# Altium footprint library UltraZOhm_CarrierBoard.PcbLib: 123 footprints (part 3 of 8)
Each footprint in its own frame and in the unit in brackets; x right, y up, seen from the top. Pads: shape width x height; smd on the part's side, far side on the other; paste and mask are expansions set on the pad; w line width, h text height; cw(c..) or ccw(c..) is an arc to the next point about the centre after c.
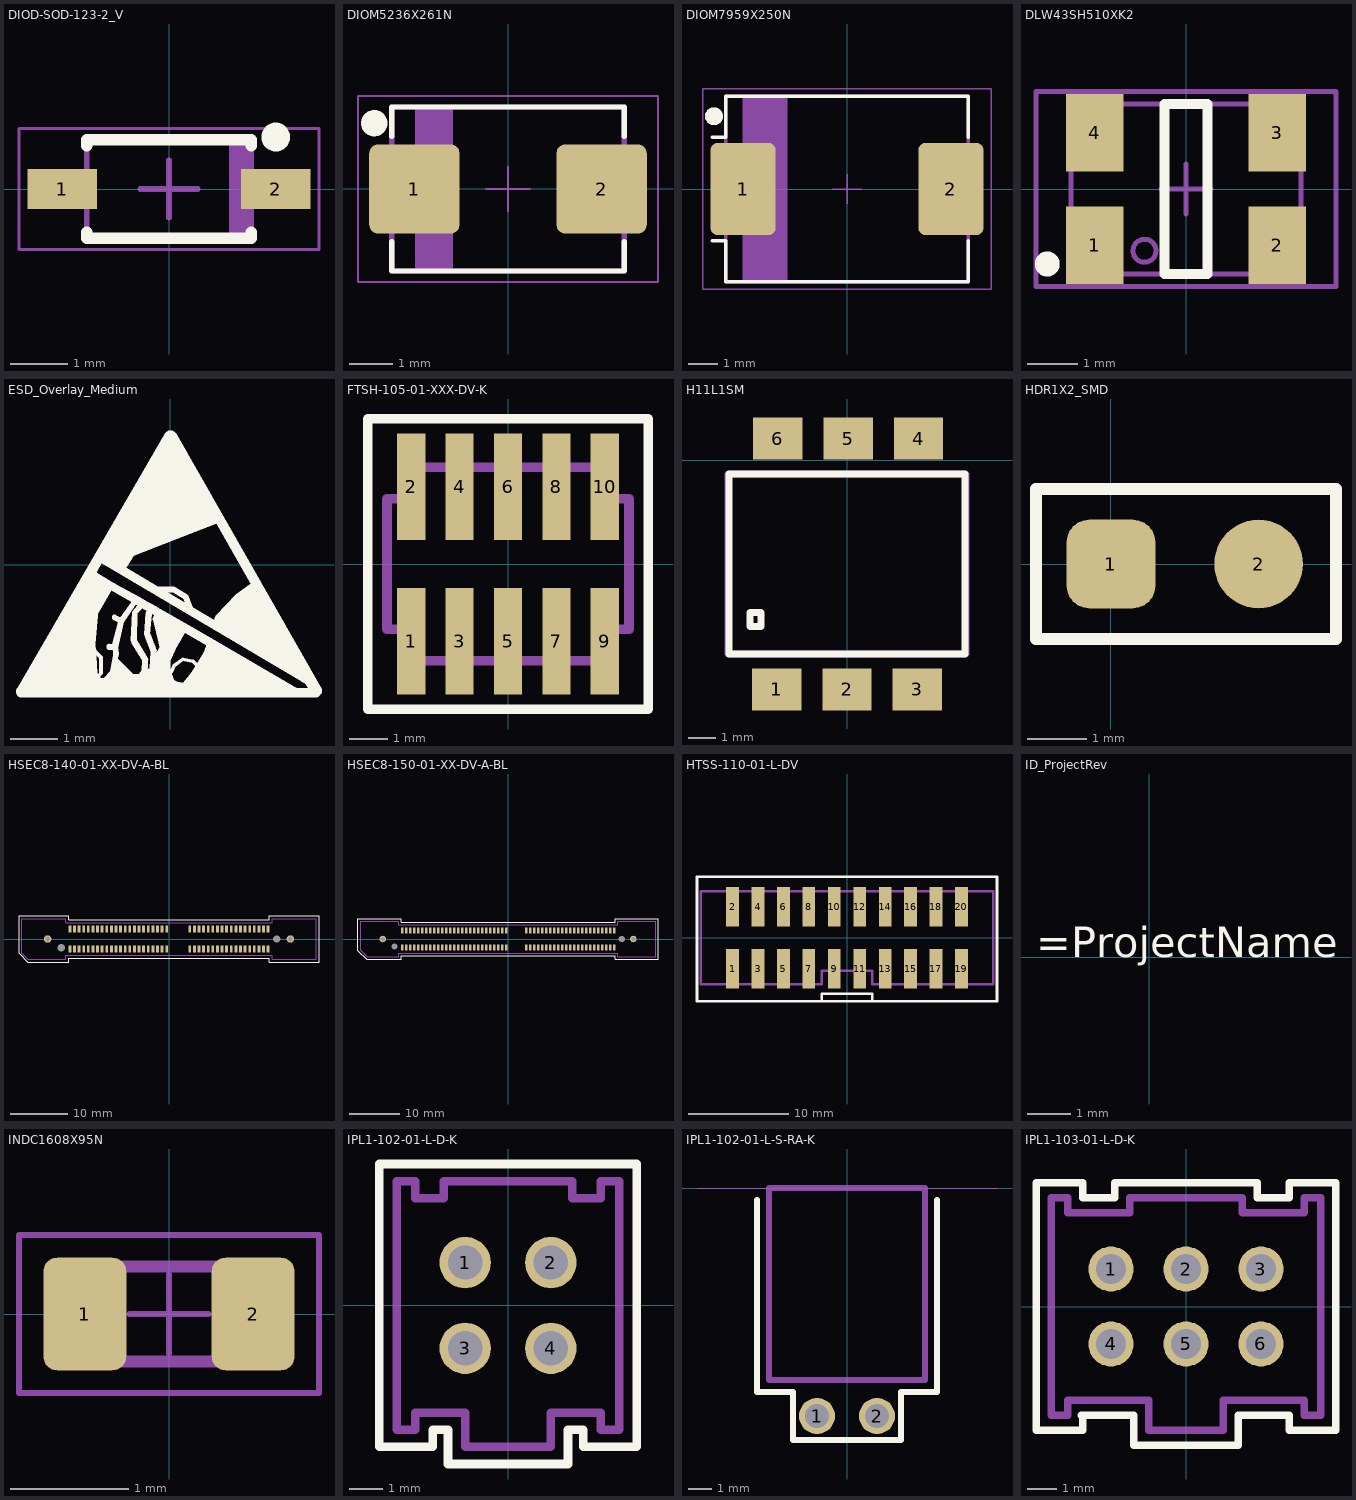
[diagram p2: the footprints below, top view; thin cyan lines are the x and y axes]

## DIOD-SOD-123-2_V [mm] "SOD-123, 2-Leads, Body 2.85x1.7mm (max), Pitch 3.7mm"
height 1.45
pads (2):
  rect 1.2x0.7 smd: 1(-1.85,0) 2(1.85,0)
Top Overlay:
  circle w0.25: c1.85,0.9 r0.125
  lines w0.2: -1.425,-0.75 -1.425,-0.85 1.425,-0.85 1.425,-0.75 ; -1.425,0.75 -1.425,0.85 1.425,0.85 1.425,0.75
Top Assembly:
  rectangle: 1.042,-0.85 1.425,0.85
  lines w0.1: -1.425,-0.85 -1.425,0.85 1.425,0.85 1.425,-0.85 -1.425,-0.85
  text ".Designator" at -1.12,-0.39 h0.76
Mechanical 15:
  lines w0.05: -2.6,-1.05 -2.6,1.05 2.6,1.05 2.6,-1.05 -2.6,-1.05
  lines w0.1: -0.5,0 0.5,0 ; 0,-0.5 0,0.5
3D body: height 1.45, standoff 0, extent -1.425,-0.85 1.425,0.85

## DIOM5236X261N [mm]
height 2.61
pads (2):
  rrect20% 2.06x2.04 smd: 1(-2.135,0) 2(2.135,0)
Top Overlay:
  circle w0.3: c-3.05,1.5 r0.15
  lines w0.12: -2.65,-1.2 -2.65,-1.87 2.65,-1.87 2.65,-1.2 ; -2.65,1.2 -2.65,1.87 2.65,1.87 2.65,1.2
Top Assembly:
  rectangle: -2.125,-1.875 -1.25,1.875
  lines w0.12: -2.65,-1.87 -2.65,1.87 2.65,1.87 2.65,-1.87 -2.65,-1.87
  text ".Designator" at -0.9,-0.775 h1.52
Mechanical 15:
  lines w0.05: -0.5,0 0.5,0 ; 0,-0.5 0,0.5 ; -3.42,-2.12 -3.42,2.12 3.42,2.12 3.42,-2.12 -3.42,-2.12
3D body "User Library-DO-214AA_SMB.STEP": height 2.2, standoff -0.05, extent -2.65,-1.85 2.65,1.85

## DIOM7959X250N [mm]
height 2.5
pads (2):
  rrect20% 2.18x3.09 smd: 1(-3.485,0) 2(3.485,0)
Top Overlay:
  circle w0.3: c-4.46,2.44 r0.15
  lines w0.12: -4.51,-1.74 -4.07,-1.74 -4.07,-3.11 4.07,-3.11 4.07,-1.74 ; -4.51,1.74 -4.07,1.74 -4.07,3.11 4.07,3.11 4.07,1.74
Top Assembly:
  rectangle: -3.5,-3.1 -2,3.11
  lines w0.12: -4.07,-3.11 4.07,-3.11 4.07,3.11 -4.07,3.11 -4.07,-3.11
  text ".Designator" at -1.5,-0.875 h1.52
Mechanical 15:
  lines w0.05: -0.5,0 0.5,0 ; 0,-0.5 0,0.5 ; -4.83,-3.36 4.83,-3.36 4.83,3.36 -4.83,3.36 -4.83,-3.36
3D body "User Library-DIOM8261X24.STEP": height 2.4, standoff 0.03, extent -4.065,-3.05 4.065,3.05

## DLW43SH510XK2 [mm] "SMD Line Filter, 4-Leads, Body 4.5x3.2mm"
height 3
pads (4):
  rect 1.15x1.55 smd: 1(-1.825,-1.125) 2(1.825,-1.125) 3(1.825,1.125) 4(-1.825,1.125)
Top Overlay:
  circle w0.25: c-2.775,-1.5 r0.125
  lines w0.2: -0.425,-1.7 -0.425,1.7 0.425,1.7 0.425,-1.7 -0.425,-1.7
Top Assembly:
  lines w0.1: -2.3,-1.7 -2.3,1.7 2.3,1.7 2.3,-1.7 -2.3,-1.7 ; -0.6,-1.25 ccw(c-0.829,-1.235) -0.6,-1.25
  text ".Designator" at -1.2,-0.275 h1.52
Mechanical 15:
  lines w0.1: -0.5,0 0.5,0 ; 0,-0.5 0,0.5 ; -3,-1.95 -3,1.95 3,1.95 3,-1.95 -3,-1.95
3D body "WE-CNSW_1812_CNSW.stp": height 2.8, standoff -0.05, extent -2.25,-1.6 2.25,1.6

## ESD_Overlay_Medium [mm]
height 11.303
Top Overlay:
  drawing of 6916 lines, arcs and shapes, not listed

## FTSH-105-01-XXX-DV-K [mil]
pads (10):
  rect 29x110 smd mask+2: 1(-100,-80) 2(-100,80) 3(-50,-80) 4(-50,80) 5(0,-80) 6(0,80) 7(50,-80) 8(50,80) 9(100,-80) 10(100,80)
Top Overlay:
  lines w10: -145,-150 -145,150 145,150 145,-150 -145,-150
Top Assembly:
  lines w10: -125,-67.5 -125,67.5 -100,67.5 -100,100 100,100 100,67.5 125,67.5 125,-67.5 100,-67.5 100,-100 -100,-100 -100,-67.5 -125,-67.5
  text ".Designator" at -64.38,-32.26 h60
3D body "FTSH-105-01-L-DV-K.stp": height 225, standoff -16, extent -125,-115 125,115

## H11L1SM [mm] "Optokoppler + Schmitt-Trigger, 1 MHz, SMT 6-Pin (Lead Bend)"
height 5.08
pads (6):
  rect 1.78x1.52 smd: 1(-2.54,-8.27) 2(0,-8.27) 3(2.54,-8.27) 4(2.58,0.775) 5(0.04,0.775) 6(-2.5,0.775)
Top Overlay:
  lines w0.254: -4.25,-7 -4.25,-0.5 4.25,-0.5 4.25,-7 -4.25,-7 ; -3.5,-6 -3.1,-6 -3.1,-5.5 -3.5,-5.5 -3.5,-6
Top Assembly:
  lines w0.254: -4.3,-7 4.3,-7 4.3,-0.5 -4.3,-0.5 -4.3,-7
  text ".Designator" at -2.1,-4.675 h1.52
3D body: height 5.08, standoff 0.38, extent -4.25,-7 4.25,-0.5

## HDR1X2_SMD [mm] "SMD Connector; Header; 2 Position"
pads (2):
  rrect50% 1.5x1.5 smd: 1(0,0)
  round 1.5 smd: 2(2.5,0)
Top Overlay:
  lines w0.2: -1.27,-1.27 -1.27,1.27 3.81,1.27 3.81,-1.27 -1.27,-1.27
Top Assembly:
  lines w0.2: -1.27,-1.27 3.81,-1.27 3.81,1.27 -1.27,1.27 -1.27,-1.27
  text ".Designator" at -0.8,-0.775 h1.52

## HSEC8-140-01-XX-DV-A-BL [mm]
pads (84):
  rect 0.5x1.2 smd mask+0.05: 1(-17.2,-1.7) 2(-17.2,1.7) 3(-16.4,-1.7) 4(-16.4,1.7) 5(-15.6,-1.7) 6(-15.6,1.7) 7(-14.8,-1.7) 8(-14.8,1.7) 9(-14,-1.7) 10(-14,1.7) 11(-13.2,-1.7) 12(-13.2,1.7) 13(-12.4,-1.7) 14(-12.4,1.7) 15(-11.6,-1.7) 16(-11.6,1.7) 17(-10.8,-1.7) 18(-10.8,1.7) 19(-10,-1.7) 20(-10,1.7) 21(-9.2,-1.7) 22(-9.2,1.7) 23(-8.4,-1.7) 24(-8.4,1.7) 25(-7.6,-1.7) 26(-7.6,1.7) 27(-6.8,-1.7) 28(-6.8,1.7) 29(-6,-1.7) 30(-6,1.7) 31(-5.2,-1.7) 32(-5.2,1.7) 33(-4.4,-1.7) 34(-4.4,1.7) 35(-3.6,-1.7) 36(-3.6,1.7) 37(-2.8,-1.7) 38(-2.8,1.7) 39(-2,-1.7) 40(-2,1.7) 41(-1.2,-1.7) 42(-1.2,1.7) 43(-0.4,-1.7) 44(-0.4,1.7) 45(3.6,-1.7) 46(3.6,1.7) 47(4.4,-1.7) 48(4.4,1.7) 49(5.2,-1.7) 50(5.2,1.7) 51(6,-1.7) 52(6,1.7) 53(6.8,-1.7) 54(6.8,1.7) 55(7.6,-1.7) 56(7.6,1.7) 57(8.4,-1.7) 58(8.4,1.7) 59(9.2,-1.7) 60(9.2,1.7) 61(10,-1.7) 62(10,1.7) 63(10.8,-1.7) 64(10.8,1.7) 65(11.6,-1.7) 66(11.6,1.7) 67(12.4,-1.7) 68(12.4,1.7) 69(13.2,-1.7) 70(13.2,1.7) 71(14,-1.7) 72(14,1.7) 73(14.8,-1.7) 74(14.8,1.7) 75(15.6,-1.7) 76(15.6,1.7) 77(16.4,-1.7) 78(16.4,1.7) 79(17.2,-1.7) 80(17.2,1.7)
  round 1.3 hole 0.84 mask+0.075: G1(-21.05,0) G2(21.05,0)
  round 0 hole 1.27 unplated: MH1(-18.7,-1.5) MH2(18.7,0)
Top Overlay:
  lines w0.178: -26.025,-2.5 -26.025,4 -17.4,4 -17.4,3.3 17.4,3.3 17.4,4 26.025,4 26.025,-4 17.4,-4 17.4,-3.3 -17.4,-3.3 -17.4,-4 -24.525,-4 -26.025,-2.5
Top Assembly:
  lines w0.178: -25.525,-2.5 -24.525,-3.5 -17.9,-3.5 -17.9,-2.8 17.9,-2.8 17.9,-3.5 25.525,-3.5 25.525,3.5 17.9,3.5 17.9,2.8 -17.9,2.8 -17.9,3.5 -25.525,3.5 -25.525,-2.5
  text ".Designator" at -2,-0.775 h1.52
3D body "HSEC8-140-01-L-DV-A-BL.stp": height 12.2, standoff -1.5, extent -25.525,-3.5 25.525,3.5

## HSEC8-150-01-XX-DV-A-BL [mm]
pads (104):
  rect 0.5x1.2 smd mask+0.05: 1(-21.2,-1.7) 2(-21.2,1.7) 3(-20.4,-1.7) 4(-20.4,1.7) 5(-19.6,-1.7) 6(-19.6,1.7) 7(-18.8,-1.7) 8(-18.8,1.7) 9(-18,-1.7) 10(-18,1.7) 11(-17.2,-1.7) 12(-17.2,1.7) 13(-16.4,-1.7) 14(-16.4,1.7) 15(-15.6,-1.7) 16(-15.6,1.7) 17(-14.8,-1.7) 18(-14.8,1.7) 19(-14,-1.7) 20(-14,1.7) 21(-13.2,-1.7) 22(-13.2,1.7) 23(-12.4,-1.7) 24(-12.4,1.7) 25(-11.6,-1.7) 26(-11.6,1.7) 27(-10.8,-1.7) 28(-10.8,1.7) 29(-10,-1.7) 30(-10,1.7) 31(-9.2,-1.7) 32(-9.2,1.7) 33(-8.4,-1.7) 34(-8.4,1.7) 35(-7.6,-1.7) 36(-7.6,1.7) 37(-6.8,-1.7) 38(-6.8,1.7) 39(-6,-1.7) 40(-6,1.7) 41(-5.2,-1.7) 42(-5.2,1.7) 43(-4.4,-1.7) 44(-4.4,1.7) 45(-3.6,-1.7) 46(-3.6,1.7) 47(-2.8,-1.7) 48(-2.8,1.7) 49(-2,-1.7) 50(-2,1.7) 51(-1.2,-1.7) 52(-1.2,1.7) 53(-0.4,-1.7) 54(-0.4,1.7) 55(3.6,-1.7) 56(3.6,1.7) 57(4.4,-1.7) 58(4.4,1.7) 59(5.2,-1.7) 60(5.2,1.7) 61(6,-1.7) 62(6,1.7) 63(6.8,-1.7) 64(6.8,1.7) 65(7.6,-1.7) 66(7.6,1.7) 67(8.4,-1.7) 68(8.4,1.7) 69(9.2,-1.7) 70(9.2,1.7) 71(10,-1.7) 72(10,1.7) 73(10.8,-1.7) 74(10.8,1.7) 75(11.6,-1.7) 76(11.6,1.7) 77(12.4,-1.7) 78(12.4,1.7) 79(13.2,-1.7) 80(13.2,1.7) 81(14,-1.7) 82(14,1.7) 83(14.8,-1.7) 84(14.8,1.7) 85(15.6,-1.7) 86(15.6,1.7) 87(16.4,-1.7) 88(16.4,1.7) 89(17.2,-1.7) 90(17.2,1.7) 91(18,-1.7) 92(18,1.7) 93(18.8,-1.7) 94(18.8,1.7) 95(19.6,-1.7) 96(19.6,1.7) 97(20.4,-1.7) 98(20.4,1.7) 99(21.2,-1.7) 100(21.2,1.7)
  round 1.3 hole 0.84 mask+0.075: G1(-25.05,0) G2(25.05,0)
  round 0 hole 1.27 unplated: MH1(-22.7,-1.5) MH2(22.7,0)
Top Overlay:
  lines w0.178: -30.002,-2.3 -30.002,4 -21.4,4 -21.4,3.3 21.4,3.3 21.4,4 29.972,4 29.972,-4 21.4,-4 21.4,-3.3 -21.4,-3.3 -21.4,-4 -28.302,-4 -30.002,-2.3
Top Assembly:
  lines w0.178: -29.502,-2.2 -28.202,-3.5 -21.9,-3.5 -21.9,-2.8 21.9,-2.8 21.9,-3.5 29.502,-3.5 29.502,3.5 21.9,3.5 21.9,2.8 -21.9,2.8 -21.9,3.5 -29.502,3.5 -29.502,-2.2
  text ".Designator" at -0.497,-0.508 h1.52
3D body "HSEC8-150-01-L-DV-A-BL.stp": height 12.2, standoff -1.5, extent -29.525,-3.5 29.525,3.5

## HTSS-110-01-L-DV [mil]
pads (20):
  rect 50x155 smd mask+2: 1(-450,-122.5) 2(-450,122.5) 3(-350,-122.5) 4(-350,122.5) 5(-250,-122.5) 6(-250,122.5) 7(-150,-122.5) 8(-150,122.5) 9(-50,-122.5) 10(-50,122.5) 11(50,-122.5) 12(50,122.5) 13(150,-122.5) 14(150,122.5) 15(250,-122.5) 16(250,122.5) 17(350,-122.5) 18(350,122.5) 19(450,-122.5) 20(450,122.5)
Top Overlay:
  lines w10: -100,-250 -100,-220 100,-220 100,-250 ; -590,-250 -590,240 590,240 590,-250 -590,-250
Top Assembly:
  lines w10: -575.03,182.48 -575,-182.48 -100,-182.48 ; -575,182.48 575,182.48 575,-182.48 100,-182.48 ; -100,-182.23 -100,-130 100,-130 100,-182.23
  text ".Designator" at -78.74,-30.51 h60
3D body "HTSS-110-01-L-DV.stp": height 400, standoff 0, extent -575,-220 575,220

## ID_ProjectRev [mm] "project name + revision number"
Top Overlay:
  text "=ProjectName" at -2.627,-0.002 h0.7

## INDC1608X95N [mm]
height 0.95
pads (2):
  rrect33% 0.7x0.95 smd: 1(-0.71,0) 2(0.71,0)
Top Assembly:
  lines w0.1: -0.5,-0.4 -0.5,0.4 ; 0.5,-0.4 0.5,0.4 ; -0.8,-0.4 -0.8,0.4 0.8,0.4 0.8,-0.4 -0.8,-0.4
  text ".Designator" at -0.7,0.775 h0.76
Mechanical 15:
  lines w0.05: -0.333,0 0.333,0 ; 0,-0.333 0,0.333 ; -1.265,-0.665 -1.265,0.665 1.265,0.665 1.265,-0.665 -1.265,-0.665
3D body "User Library-Chip InductorINDC1608X95N.STEP": height 0.8, standoff 0, extent -0.8,-0.475 0.8,0.475

## IPL1-102-01-L-D-K [mil]
pads (4):
  round 60 hole 40 mask+3: 1(-50,50) 2(50,50) 3(-50,-50) 4(50,-50)
Top Overlay:
  lines w10: -95,165 95,165 ; -88,165 -150,165 -150,-165 -88,-165 -88,-145 -70,-145 -70,-185 70,-185 70,-145 88,-145 88,-165 150,-165 150,165 88,165
Top Assembly:
  lines w10: -130,-145 -130,145 -108,145 -108,125 -75,125 -75,145 75,145 75,125 108,125 108,145 130,145 130,-145 108,-145 108,-125 50,-125 50,-165 -50,-165 -50,-125 -108,-125 -108,-145 -130,-145
  text ".Designator" at -74.8,-39.37 h60
3D body "IPL1-102-01-F-D-K.stp": height 320, standoff -120, extent -130,-165 130,145

## IPL1-102-01-L-S-RA-K [mil]
pads (2):
  round 60 hole 40 mask+3: 1(-50,-380) 2(50,-380)
Top Overlay:
  lines w10: -150,-20 -150,-340 -90,-340 -90,-420 90,-420 90,-340 150,-340 150,-20
Top Assembly:
  lines w10: -130,-320 130,-320 130,0 -130,0 -130,-320
  text ".Designator" at -66.93,-259.84 h60
Mechanical 16:
  lines w0.01: -250,0 250,0
3D body "IPL1-102-01-L-S-RA-K.stp": height 260, standoff -85, extent -129.99,-392.49 130.01,0.01

## IPL1-103-01-L-D-K [mil]
pads (6):
  round 60 hole 40 mask+3: 1(-100,50) 2(0,50) 3(100,50) 4(-100,-50) 5(0,-50) 6(100,-50)
Top Overlay:
  lines w10: -140,-145 -70,-145 -70,-185 70,-185 70,-145 138,-145 138,-165 200,-165 200,165 138,165 138,145 95,145 95,165 -95,165 -95,145 -138,145 -138,165 -200,165 -200,-165 -138,-165 -138,-145
Top Assembly:
  lines w10: -180,-145 -158,-145 -158,-125 -50,-125 -50,-165 50,-165 50,-125 158,-125 158,-145 180,-145 180,145 158,145 158,125 75,125 75,145 -75,145 -75,125 -158,125 -158,145 -180,145 -180,-145
  text ".Designator" at -82.68,-39.37 h60
3D body "IPL1-103-01-L-D-K.stp": height 320, standoff -120, extent -180,-165 180,145